# Altium footprint library ICs And Semiconductors SMD.PcbLib: 943 footprints (part 11 of 60)
Each footprint in its own frame and in the unit in brackets; x right, y up, seen from the top. Pads: shape width x height; smd on the part's side, far side on the other; paste and mask are expansions set on the pad; w line width, h text height; cw(c..) or ccw(c..) is an arc to the next point about the centre after c.
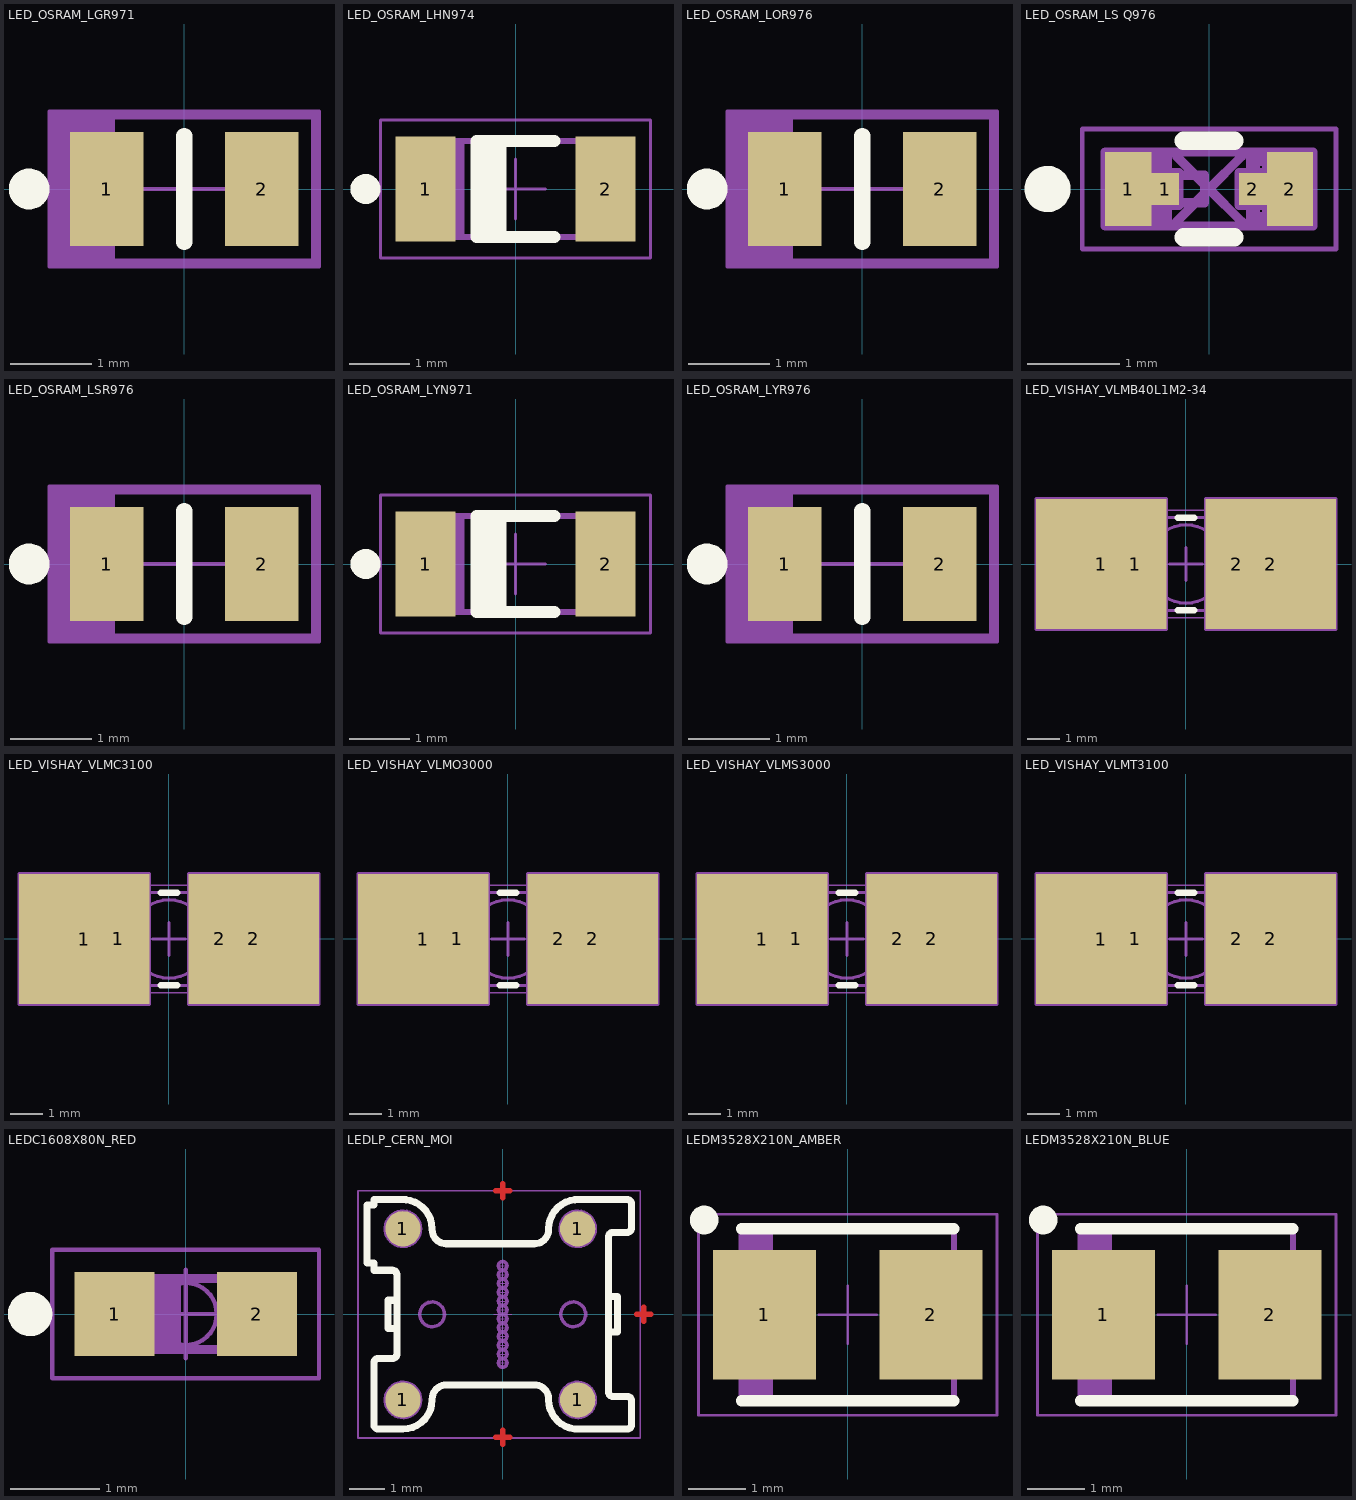
[diagram p10: the footprints below, top view; thin cyan lines are the x and y axes]

## LED_OSRAM_LGR971 [mm] "Green Chip LED, 2-Leads, Body 2.0x1.25mm, IPC Medium Density"
height 0.9
pads (2):
  rect 0.9x1.4 smd: 1(-0.95,0) 2(0.95,0)
Top Overlay:
  circle w0.25: c-1.9,0 r0.125
  lines w0.2: 0,-0.65 0,0.65
Mechanical 14:
  lines w0.1: -1.5,-0.9 -1.5,0.9 ; -1.4,-0.9 -1.4,0.9 ; -1.3,-0.9 -1.3,0.9 ; -1.2,-0.9 -1.2,0.9 ; -1.1,-0.9 -1.1,0.9 ; -1,-0.9 -1,0.9 ; -0.9,-0.9 -0.9,0.9 ; -1.6,-0.9 1.6,-0.9 1.6,0.9 -1.6,0.9 -1.6,-0.9
Mechanical 15:
  lines w0.05: -0.5,0 0.5,0 ; 0,-0.5 0,0.5 ; -1.65,-0.95 1.65,-0.95 1.65,0.95 -1.65,0.95 -1.65,-0.95
3D body "LED_OSRAM_LGR971.stp": height 0.9, standoff 0, extent -1.05,-0.675 1.05,0.675

## LED_OSRAM_LHN974 [mm] "Red Chip LED, 2-Leads, Body 3.2 x1.6mm, IPC Medium Density"
height 1.2
pads (2):
  rect 1x1.75 smd: 1(-1.5,0) 2(1.5,0)
Top Overlay:
  circle w0.25: c-2.5,0 r0.125
  lines w0.2: -0.45,-0.8 -0.45,0.8 ; -0.25,-0.8 -0.25,0.8 ; 0.65,-0.8 -0.65,-0.8 -0.65,0.8 0.65,0.8
Mechanical 14:
  lines w0.1: -1.5,-0.8 -1.5,0.8 ; -1.4,-0.8 -1.4,0.8 ; -1.3,-0.8 -1.3,0.8 ; -1.2,-0.8 -1.2,0.8 ; -1.1,-0.8 -1.1,0.8 ; -1,-0.8 -1,0.8 ; -0.9,-0.8 -0.9,0.8 ; -1.6,-0.8 -1.6,0.8 1.6,0.8 1.6,-0.8 -1.6,-0.8
Mechanical 15:
  lines w0.05: -0.5,0 0.5,0 ; 0,-0.5 0,0.5 ; -2.25,-1.15 -2.25,1.15 2.25,1.15 2.25,-1.15 -2.25,-1.15
3D body "LED_OSRAM_LHN974.stp": height 1.2, standoff 0, extent -1.65,-0.85 1.65,0.85

## LED_OSRAM_LOR976 [mm] "Orange Chip LED, 2-Leads, Body 2.0x1.25mm, IPC Medium Density"
height 0.9
pads (2):
  rect 0.9x1.4 smd: 1(-0.95,0) 2(0.95,0)
Top Overlay:
  circle w0.25: c-1.9,0 r0.125
  lines w0.2: 0,-0.65 0,0.65
Mechanical 14:
  lines w0.1: -1.5,-0.9 -1.5,0.9 ; -1.4,-0.9 -1.4,0.9 ; -1.3,-0.9 -1.3,0.9 ; -1.2,-0.9 -1.2,0.9 ; -1.1,-0.9 -1.1,0.9 ; -1,-0.9 -1,0.9 ; -0.9,-0.9 -0.9,0.9 ; -1.6,-0.9 -1.6,0.9 1.6,0.9 1.6,-0.9 -1.6,-0.9
Mechanical 15:
  lines w0.05: -0.5,0 0.5,0 ; 0,-0.5 0,0.5 ; -1.65,-0.95 -1.65,0.95 1.65,0.95 1.65,-0.95 -1.65,-0.95
3D body "LED_OSRAM_LOR976.stp": height 0.9, standoff 0, extent -1.05,-0.675 1.05,0.675

## LED_OSRAM_LS Q976 [mm] "Chip Super RED LED, 2-Leads, Body 1.6x0.8mm"
height 0.8
pads (4):
  rect 0.5x0.8 smd: 1(-0.875,0) 2(0.875,0)
  rect 0.3x0.35 smd: 1(-0.475,0) 2(0.475,0)
Top Overlay:
  circle w0.25: c-1.75,0 r0.125
  lines w0.2: -0.275,-0.525 0.275,-0.525 ; -0.275,0.525 0.275,0.525
Mechanical 8:
  lines w0.1: -0.354,-0.354 0,0 ; -0.354,0.354 0,0 ; 0.354,-0.354 0,0 ; 0.354,0.354 0,0 ; -1.125,-0.4 -0.875,0 -1.125,0.4 ; -1.125,-0.4 -0.625,-0.4 -0.625,-0.175 -0.325,-0.175 ; -1.125,-0.4 -1.125,0.4 ; -1.125,0.4 -0.625,0.4 -0.625,0.175 -0.325,0.175 ; -0.325,-0.175 -0.475,0 -0.325,0.175 ; -0.325,-0.175 -0.325,0.175 ; 0.325,-0.175 0.475,0 0.325,0.175 ; 0.325,-0.175 0.625,-0.175 0.625,-0.4 1.125,-0.4 ; 0.325,-0.175 0.325,0.175 ; 0.325,0.175 0.625,0.175 0.625,0.4 1.125,0.4 ; 1.125,-0.4 0.875,0 1.125,0.4 ; 1.125,-0.4 1.125,0.4
Mechanical 14:
  lines w0.1: -0.8,-0.3 -0.5,-0.3 ; -0.8,0.3 -0.499,0.3 ; -0.548,-0.4 -0.548,0.4 ; -0.5,-0.4 -0.5,0.4 ; -0.499,-0.2 -0.8,-0.2 ; -0.499,0.2 -0.8,0.2 ; -0.452,-0.4 -0.452,0.4 ; 0.452,-0.4 0.452,0.4 ; 0.499,-0.3 0.8,-0.3 ; 0.5,-0.4 0.5,0.4 ; 0.5,0.3 0.8,0.3 ; -0.8,-0.2 ccw(c-0.8,0) -0.8,0.2 ; -0.8,-0.2 -0.8,-0.4 0.8,-0.4 0.8,-0.2 cw(c0.8,0) 0.8,0.2 0.8,0.4 -0.8,0.4 -0.8,0.2 ; -0.35,-0.15 -0.05,-0.15 -0.05,0.15 -0.35,0.15 -0.35,-0.15
Mechanical 15:
  lines w0.05: -1.375,-0.65 -1.375,0.65 1.375,0.65 1.375,-0.65 -1.375,-0.65
3D body "LED_OSRAM_LS Q976_Part1.stp": height 0.51, standoff 0, extent -0.8,-0.4 0.8,0.4
3D body "LED_OSRAM_LS Q976_Part2.stp": height 0.8, standoff 0.31, extent -0.5,-0.4 0.5,0.4

## LED_OSRAM_LSR976 [mm] "Super Red Chip LED, 2-Leads, Body 2.0x1.25mm, IPC Medium Density"
height 0.9
pads (2):
  rect 0.9x1.4 smd: 1(-0.95,0) 2(0.95,0)
Top Overlay:
  circle w0.25: c-1.9,0 r0.125
  lines w0.2: 0,-0.65 0,0.65
Mechanical 14:
  lines w0.1: -1.5,-0.9 -1.5,0.9 ; -1.4,-0.9 -1.4,0.9 ; -1.3,-0.9 -1.3,0.9 ; -1.2,-0.9 -1.2,0.9 ; -1.1,-0.9 -1.1,0.9 ; -1,-0.9 -1,0.9 ; -0.9,-0.9 -0.9,0.9 ; -1.6,-0.9 1.6,-0.9 1.6,0.9 -1.6,0.9 -1.6,-0.9
Mechanical 15:
  lines w0.05: -0.5,0 0.5,0 ; 0,-0.5 0,0.5 ; -1.65,-0.95 1.65,-0.95 1.65,0.95 -1.65,0.95 -1.65,-0.95
3D body "LED_OSRAM_LSR976.stp": height 0.9, standoff 0, extent -1.05,-0.675 1.05,0.675

## LED_OSRAM_LYN971 [mm] "Yellow Chip LED, 2-Leads, Body 3.2 x1.6mm, IPC Medium Density"
height 1.2
pads (2):
  rect 1x1.75 smd: 1(-1.5,0) 2(1.5,0)
Top Overlay:
  circle w0.25: c-2.5,0 r0.125
  lines w0.2: -0.45,-0.8 -0.45,0.8 ; -0.25,-0.8 -0.25,0.8 ; 0.65,-0.8 -0.65,-0.8 -0.65,0.8 0.65,0.8
Mechanical 14:
  lines w0.1: -1.5,-0.8 -1.5,0.8 ; -1.4,-0.8 -1.4,0.8 ; -1.3,-0.8 -1.3,0.8 ; -1.2,-0.8 -1.2,0.8 ; -1.1,-0.8 -1.1,0.8 ; -1,-0.8 -1,0.8 ; -0.9,-0.8 -0.9,0.8 ; -1.6,-0.8 1.6,-0.8 1.6,0.8 -1.6,0.8 -1.6,-0.8
Mechanical 15:
  lines w0.05: -0.5,0 0.5,0 ; 0,-0.5 0,0.5 ; -2.25,-1.15 2.25,-1.15 2.25,1.15 -2.25,1.15 -2.25,-1.15
3D body "LED_OSRAM_LYN971.stp": height 1.2, standoff 0, extent -1.65,-0.85 1.65,0.85

## LED_OSRAM_LYR976 [mm] "Yellow Chip LED, 2-Leads, Body 2.0x1.25mm, IPC Medium Density"
height 0.9
pads (2):
  rect 0.9x1.4 smd: 1(-0.95,0) 2(0.95,0)
Top Overlay:
  circle w0.25: c-1.9,0 r0.125
  lines w0.2: 0,-0.65 0,0.65
Mechanical 14:
  lines w0.1: -1.5,-0.9 -1.5,0.9 ; -1.4,-0.9 -1.4,0.9 ; -1.3,-0.9 -1.3,0.9 ; -1.2,-0.9 -1.2,0.9 ; -1.1,-0.9 -1.1,0.9 ; -1,-0.9 -1,0.9 ; -0.9,-0.9 -0.9,0.9 ; -1.6,-0.9 -1.6,0.9 1.6,0.9 1.6,-0.9 -1.6,-0.9
Mechanical 15:
  lines w0.05: -0.5,0 0.5,0 ; 0,-0.5 0,0.5 ; -1.65,-0.95 -1.65,0.95 1.65,0.95 1.65,-0.95 -1.65,-0.95
3D body "LED_OSRAM_LYR976.stp": height 0.9, standoff 0, extent -1.05,-0.675 1.05,0.675

## LED_VISHAY_VLMB40L1M2-34 [mm] "PLCC-2 Molded SMD Blue LED, 2-Leads, Body 3.5x2.8mm"
height 1.85
pads (4):
  rect 4x4 smd paste-2 mask-2: 1(-2.6,0) 2(2.6,0)
  rect 1.9x2.8 smd: 1(-1.55,0) 2(1.55,0)
Top Overlay:
  circle w0.25: c-2.9,1.65 r0.125
  lines w0.2: -0.25,-1.425 0.25,-1.425 ; -0.25,1.425 0.25,1.425
Mechanical 8:
  lines w0.1: -2.05,0 -1.55,0 ; -1.55,-0.5 -1.55,0 ; -1.55,0.5 -1.55,0 ; -1.05,0 -1.55,0 ; -0.5,0 0,0 ; 0,-0.5 0,0 ; 0,0.5 0,0 ; 0.5,0 0,0 ; 1.05,0 1.55,0 ; 1.55,-0.5 1.55,0 ; 1.55,0.5 1.55,0 ; 2.05,0 1.55,0 ; -4.6,-2 -4.6,2 -0.6,2 -0.6,-2 -4.6,-2 ; -2.5,-1.4 -2.5,1.4 -0.6,1.4 -0.6,-1.4 -2.5,-1.4 ; 0.6,-2 0.6,2 4.6,2 4.6,-2 0.6,-2 ; 0.6,-1.4 0.6,1.4 2.5,1.4 2.5,-1.4 0.6,-1.4
Mechanical 14:
  circle w0.1: c0,0 r1.2
  lines w0.1: -1.85,1.1 -1.85,-1.1 -1.575,-1.1 ; -1.849,1.1 -1.575,1.1 ; -1.575,0.618 -0.768,1.425 ; -1.575,0.759 -0.909,1.425 ; -1.575,0.901 -1.051,1.425 ; -1.575,1.042 -1.192,1.425 ; -1.575,1.184 -1.334,1.425 ; -1.575,1.325 -1.475,1.425 ; 1.575,-1.1 1.85,-1.1 1.85,1.1 1.575,1.1 ; -1.575,-1.425 -1.575,1.425 ; -1.575,-1.425 1.575,-1.425 1.575,1.425 -1.575,1.425 ; -1.575,-1.425 -1.575,1.425
Mechanical 15:
  lines w0.05: -2.75,-1.65 -2.75,1.65 2.75,1.65 2.75,-1.65 -2.75,-1.65
3D body "LED_VISHAY_VLMB40L1M2-34.stp": height 1.75, standoff 0, extent -1.85,-1.425 1.85,1.425

## LED_VISHAY_VLMC3100 [mm] "Molded SMD Green LED, 2-Leads, Body 3.5x2.8mm, VLMC3100 Series"
height 1.85
pads (4):
  rect 4x4 smd paste-2 mask-2: 1(-2.6,0) 2(2.6,0)
  rect 1.9x2.8 smd: 1(-1.55,0) 2(1.55,0)
Top Overlay:
  circle w0.25: c-2.9,1.65 r0.125
  lines w0.2: -0.25,-1.425 0.25,-1.425 ; -0.25,1.425 0.25,1.425
Mechanical 8:
  lines w0.1: -2.05,0 -1.55,0 ; -1.55,-0.5 -1.55,0 ; -1.55,0.5 -1.55,0 ; -1.05,0 -1.55,0 ; -0.5,0 0,0 ; 0,-0.5 0,0 ; 0,0.5 0,0 ; 0.5,0 0,0 ; 1.05,0 1.55,0 ; 1.55,-0.5 1.55,0 ; 1.55,0.5 1.55,0 ; 2.05,0 1.55,0 ; -4.6,-2 -4.6,2 -0.6,2 -0.6,-2 -4.6,-2 ; -2.5,-1.4 -2.5,1.4 -0.6,1.4 -0.6,-1.4 -2.5,-1.4 ; 0.6,-2 0.6,2 4.6,2 4.6,-2 0.6,-2 ; 0.6,-1.4 0.6,1.4 2.5,1.4 2.5,-1.4 0.6,-1.4
Mechanical 14:
  circle w0.1: c0,0 r1.2
  lines w0.1: -1.85,1.1 -1.85,-1.1 -1.575,-1.1 ; -1.849,1.1 -1.575,1.1 ; -1.575,0.618 -0.768,1.425 ; -1.575,0.759 -0.909,1.425 ; -1.575,0.901 -1.051,1.425 ; -1.575,1.042 -1.192,1.425 ; -1.575,1.184 -1.334,1.425 ; -1.575,1.325 -1.475,1.425 ; 1.575,-1.1 1.85,-1.1 1.85,1.1 1.575,1.1 ; -1.575,-1.425 -1.575,1.425 ; -1.575,-1.425 1.575,-1.425 1.575,1.425 -1.575,1.425 ; -1.575,-1.425 -1.575,1.425
Mechanical 15:
  lines w0.05: -2.75,-1.65 -2.75,1.65 2.75,1.65 2.75,-1.65 -2.75,-1.65
3D body "LED_VISHAY_VLMC3100.stp": height 1.75, standoff 0, extent -1.85,-1.425 1.85,1.425

## LED_VISHAY_VLMO3000 [mm] "Molded SMD Orange LED, 2-Leads, Body 3.5x2.8mm, VLMO3000 Series"
height 1.85
pads (4):
  rect 4x4 smd paste-2 mask-2: 1(-2.6,0) 2(2.6,0)
  rect 1.9x2.8 smd: 1(-1.55,0) 2(1.55,0)
Top Overlay:
  circle w0.25: c-2.9,1.65 r0.125
  lines w0.2: -0.25,-1.425 0.25,-1.425 ; -0.25,1.425 0.25,1.425
Mechanical 8:
  lines w0.1: -2.05,0 -1.55,0 ; -1.55,-0.5 -1.55,0 ; -1.55,0.5 -1.55,0 ; -1.05,0 -1.55,0 ; -0.5,0 0,0 ; 0,-0.5 0,0 ; 0,0.5 0,0 ; 0.5,0 0,0 ; 1.05,0 1.55,0 ; 1.55,-0.5 1.55,0 ; 1.55,0.5 1.55,0 ; 2.05,0 1.55,0 ; -4.6,-2 -0.6,-2 -0.6,2 -4.6,2 -4.6,-2 ; -2.5,-1.4 -0.6,-1.4 -0.6,1.4 -2.5,1.4 -2.5,-1.4 ; 0.6,-2 4.6,-2 4.6,2 0.6,2 0.6,-2 ; 0.6,-1.4 2.5,-1.4 2.5,1.4 0.6,1.4 0.6,-1.4
Mechanical 14:
  circle w0.1: c0,0 r1.2
  lines w0.1: -1.85,1.1 -1.85,-1.1 -1.575,-1.1 ; -1.849,1.1 -1.575,1.1 ; -1.575,0.618 -0.768,1.425 ; -1.575,0.759 -0.909,1.425 ; -1.575,0.901 -1.051,1.425 ; -1.575,1.042 -1.192,1.425 ; -1.575,1.184 -1.334,1.425 ; -1.575,1.325 -1.475,1.425 ; 1.575,-1.1 1.85,-1.1 1.85,1.1 1.575,1.1 ; -1.575,-1.425 -1.575,1.425 ; -1.575,-1.425 1.575,-1.425 1.575,1.425 -1.575,1.425 ; -1.575,-1.425 -1.575,1.425
Mechanical 15:
  lines w0.05: -2.75,-1.65 2.75,-1.65 2.75,1.65 -2.75,1.65 -2.75,-1.65
3D body "LED_VISHAY_VLMO3000.stp": height 1.75, standoff 0, extent -1.85,-1.425 1.85,1.425

## LED_VISHAY_VLMS3000 [mm] "Molded SMD Super Red LED, 2-Leads, Body 3.5x2.8mm, VLMS3000 Series"
height 1.85
pads (4):
  rect 4x4 smd paste-2 mask-2: 1(-2.6,0) 2(2.6,0)
  rect 1.9x2.8 smd: 1(-1.55,0) 2(1.55,0)
Top Overlay:
  circle w0.25: c-2.9,1.65 r0.125
  lines w0.2: -0.25,-1.425 0.25,-1.425 ; -0.25,1.425 0.25,1.425
Mechanical 8:
  lines w0.1: -2.05,0 -1.55,0 ; -1.55,-0.5 -1.55,0 ; -1.55,0.5 -1.55,0 ; -1.05,0 -1.55,0 ; -0.5,0 0,0 ; 0,-0.5 0,0 ; 0,0.5 0,0 ; 0.5,0 0,0 ; 1.05,0 1.55,0 ; 1.55,-0.5 1.55,0 ; 1.55,0.5 1.55,0 ; 2.05,0 1.55,0 ; -4.6,-2 -4.6,2 -0.6,2 -0.6,-2 -4.6,-2 ; -2.5,-1.4 -2.5,1.4 -0.6,1.4 -0.6,-1.4 -2.5,-1.4 ; 0.6,-2 0.6,2 4.6,2 4.6,-2 0.6,-2 ; 0.6,-1.4 0.6,1.4 2.5,1.4 2.5,-1.4 0.6,-1.4
Mechanical 14:
  circle w0.1: c0,0 r1.2
  lines w0.1: -1.85,1.1 -1.85,-1.1 -1.575,-1.1 ; -1.849,1.1 -1.575,1.1 ; -1.575,0.618 -0.768,1.425 ; -1.575,0.759 -0.909,1.425 ; -1.575,0.901 -1.051,1.425 ; -1.575,1.042 -1.192,1.425 ; -1.575,1.184 -1.334,1.425 ; -1.575,1.325 -1.475,1.425 ; 1.575,-1.1 1.85,-1.1 1.85,1.1 1.575,1.1 ; -1.575,-1.425 -1.575,1.425 ; -1.575,-1.425 1.575,-1.425 1.575,1.425 -1.575,1.425 ; -1.575,-1.425 -1.575,1.425
Mechanical 15:
  lines w0.05: -2.75,-1.65 -2.75,1.65 2.75,1.65 2.75,-1.65 -2.75,-1.65
3D body "LED_VISHAY_VLMS3000.stp": height 1.75, standoff 0, extent -1.85,-1.425 1.85,1.425

## LED_VISHAY_VLMT3100 [mm] "Molded SMD Red LED, 2-Leads, Body 3.5x2.8mm, VLMT3100 Series"
height 1.85
pads (4):
  rect 4x4 smd paste-2 mask-2: 1(-2.6,0) 2(2.6,0)
  rect 1.9x2.8 smd: 1(-1.55,0) 2(1.55,0)
Top Overlay:
  circle w0.25: c-2.9,1.65 r0.125
  lines w0.2: -0.25,-1.425 0.25,-1.425 ; -0.25,1.425 0.25,1.425
Mechanical 8:
  lines w0.1: -2.05,0 -1.55,0 ; -1.55,-0.5 -1.55,0 ; -1.55,0.5 -1.55,0 ; -1.05,0 -1.55,0 ; -0.5,0 0,0 ; 0,-0.5 0,0 ; 0,0.5 0,0 ; 0.5,0 0,0 ; 1.05,0 1.55,0 ; 1.55,-0.5 1.55,0 ; 1.55,0.5 1.55,0 ; 2.05,0 1.55,0 ; -4.6,-2 -0.6,-2 -0.6,2 -4.6,2 -4.6,-2 ; -2.5,-1.4 -0.6,-1.4 -0.6,1.4 -2.5,1.4 -2.5,-1.4 ; 0.6,-2 4.6,-2 4.6,2 0.6,2 0.6,-2 ; 0.6,-1.4 2.5,-1.4 2.5,1.4 0.6,1.4 0.6,-1.4
Mechanical 14:
  circle w0.1: c0,0 r1.2
  lines w0.1: -1.85,1.1 -1.85,-1.1 -1.575,-1.1 ; -1.849,1.1 -1.575,1.1 ; -1.575,0.618 -0.768,1.425 ; -1.575,0.759 -0.909,1.425 ; -1.575,0.901 -1.051,1.425 ; -1.575,1.042 -1.192,1.425 ; -1.575,1.184 -1.334,1.425 ; -1.575,1.325 -1.475,1.425 ; 1.575,-1.1 1.85,-1.1 1.85,1.1 1.575,1.1 ; -1.575,-1.425 -1.575,1.425 ; -1.575,-1.425 1.575,-1.425 1.575,1.425 -1.575,1.425 ; -1.575,-1.425 -1.575,1.425
Mechanical 15:
  lines w0.05: -2.75,-1.65 2.75,-1.65 2.75,1.65 -2.75,1.65 -2.75,-1.65
3D body "LED_VISHAY_VLMT3100.stp": height 1.75, standoff 0, extent -1.85,-1.425 1.85,1.425

## LEDC1608X80N_RED [mm] "Chip RED LED, 2-Leads, Body 1.6x0.8mm, IPC Medium Density"
height 0.8
pads (2):
  rect 0.9x0.95 smd: 1(-0.8,0) 2(0.8,0)
Top Overlay:
  circle w0.25: c-1.75,0 r0.125
Mechanical 14:
  lines w0.1: -0.7,-0.4 -0.7,0.4 ; -0.6,-0.4 -0.6,0.4 ; -0.5,-0.4 -0.5,0.4 ; -0.4,-0.4 -0.4,0.4 ; -0.3,-0.4 -0.3,0.4 ; -0.2,-0.4 -0.2,0.4 ; -0.1,-0.4 -0.1,0.4 ; -0.8,-0.4 -0.8,0.4 0.8,0.4 0.8,-0.4 -0.8,-0.4
Mechanical 15:
  circle w0.05: c0,0 r0.35
  lines w0.05: -0.5,0 0.5,0 ; 0,-0.5 0,0.5 ; -1.5,-0.725 -1.5,0.725 1.5,0.725 1.5,-0.725 -1.5,-0.725
3D body "LEDC1608X80N_RED.stp": height 0.8, standoff 0, extent -0.8,-0.4 0.8,0.4

## LEDLP_CERN_MOI [mm] "12x Light Pipe Lens, Body 6.5 x 7.3mm"
height 1.5
pads (4):
  round 1 smd paste-0.5: 1(-2.825,-2.425) 1(-2.825,2.425) 1(2.125,-2.425) 1(2.125,2.425)
Top Layer:
  lines w0.15: -0.2,-3.48 0.2,-3.48 ; -0.2,3.5 0.2,3.5 ; 0,-3.68 0,-3.28 ; 0,3.3 0,3.7 ; 3.8,0 4.2,0 ; 4,-0.2 4,0.2
Top Overlay:
  lines w0.2: -3,-0.4 -3.25,-0.4 -3.25,0.4 -3,0.4 ; 3,-0.5 3.25,-0.5 3.25,0.5 3,0.5 ; -3.85,1.45 -3.85,3.1 -3.65,3.1 -3.65,3.25 -2.876,3.25 cw(c-2.829,2.422) -2,2.425 -2,2.399 ccw(c-1.601,2.399) -1.6,2 0.9,2 ccw(c0.901,2.399) 1.3,2.399 1.3,2.425 cw(c2.129,2.422) 2.176,3.25 3.525,3.25 cw(c3.525,3.125) 3.65,3.125 3.65,2.454 cw(c3.525,2.45) 3.525,2.325 3.125,2.325 ccw(c3.125,2.2) 3,2.2 3,-2.2 ccw(c3.125,-2.2) 3.125,-2.325 3.525,-2.325 cw(c3.525,-2.45) 3.65,-2.454 3.65,-3.125 cw(c3.525,-3.125) 3.525,-3.25 2.176,-3.25 cw(c2.129,-2.422) 1.3,-2.425 1.3,-2.399 ccw(c0.901,-2.399) 0.9,-2 -1.6,-2 ccw(c-1.601,-2.399) -2,-2.399 -2,-2.425 cw(c-2.827,-2.423) -2.828,-3.25 -3.525,-3.25 cw(c-3.525,-3.125) -3.65,-3.125 -3.65,-1.379 cw(c-3.525,-1.375) -3.525,-1.25 -3.125,-1.25 ccw(c-3.125,-1.125) -3,-1.125 -3,1.125 ccw(c-3.125,1.125) -3.125,1.25 -3.65,1.25 -3.65,1.45 -3.85,1.45
Top Solder:
  region: -0.4,3.9 -0.4,3.1 0.4,3.1 0.4,3.9
  region: -0.4,-3.08 -0.4,-3.88 0.4,-3.88 0.4,-3.08
  region: 3.6,0.4 3.6,-0.4 4.4,-0.4 4.4,0.4
Mechanical 8:
  circle w0.05: c-2.825,-2.425 r0.5
  circle w0.05: c-2.825,2.425 r0.5
  circle w0.05: c2.125,2.425 r0.5
  circle w0.05: c2.125,-2.425 r0.5
  lines w0.01: -0.25,0 0,0 ; -0.125,-1.375 0,-1.375 ; -0.125,-1.125 0,-1.125 ; -0.125,-0.875 0,-0.875 ; -0.125,-0.625 0,-0.625 ; -0.125,-0.375 0,-0.375 ; -0.125,-0.125 0,-0.125 ; -0.125,0.125 0,0.125 ; -0.125,0.375 0,0.375 ; -0.125,0.625 0,0.625 ; -0.125,0.875 0,0.875 ; -0.125,1.125 0,1.125 ; -0.125,1.375 0,1.375 ; 0,-1.5 0,-1.375 ; 0,1.5 0,1.375 ; 0.125,-1.375 0,-1.375 ; 0.125,-1.125 0,-1.125 ; 0.125,-0.875 0,-0.875 ; 0.125,-0.625 0,-0.625 ; 0.125,-0.375 0,-0.375 ; 0.125,-0.125 0,-0.125 ; 0.125,0.125 0,0.125 ; 0.125,0.375 0,0.375 ; 0.125,0.625 0,0.625 ; 0.125,0.875 0,0.875 ; 0.125,1.125 0,1.125 ; 0.125,1.375 0,1.375 ; 0.25,0 0,0 ; 0,-1.375 0,-1.25 0,-1.125 ; 0,-1.125 0,-1 0,-0.875 ; 0,-0.875 0,-0.75 0,-0.625 ; 0,-0.625 0,-0.5 0,-0.375 ; 0,-0.375 0,-0.25 ; 0,-0.25 0,0 ; 0,-0.25 0,-0.125 ; 0,-0.125 0,0 ; 0,0 0,0.25 ; 0,0 0,0.125 ; 0,0.125 0,0.25 ; 0,0.25 0,0.375 ; 0,0.375 0,0.5 0,0.625 ; 0,0.625 0,0.75 0,0.875 ; 0,0.875 0,1 0,1.125 ; 0,1.125 0,1.25 0,1.375
  lines w0.05: -3.075,-2.425 -2.825,-2.425 ; -3.075,2.425 -2.825,2.425 ; -2.825,-2.675 -2.825,-2.425 ; -2.825,-2.175 -2.825,-2.425 ; -2.825,2.175 -2.825,2.425 ; -2.825,2.675 -2.825,2.425 ; -2.575,-2.425 -2.825,-2.425 ; -2.575,2.425 -2.825,2.425 ; 1.875,-2.425 2.125,-2.425 ; 1.875,2.425 2.125,2.425 ; 2.125,-2.675 2.125,-2.425 ; 2.125,-2.175 2.125,-2.425 ; 2.125,2.175 2.125,2.425 ; 2.125,2.675 2.125,2.425 ; 2.375,-2.425 2.125,-2.425 ; 2.375,2.425 2.125,2.425
Mechanical 14:
  circle w0.1: c-2,0 r0.351
  circle w0.1: c2,0 r0.351
  circle w0.1: c-2.825,2.425 r0.5
  circle w0.1: c2.125,2.425 r0.5
  circle w0.1: c2.125,-2.425 r0.5
  circle w0.1: c-2.825,-2.425 r0.5
  circle w0.1: c0,1.375 r0.122
  circle w0.1: c0,1.125 r0.122
  circle w0.1: c0,0.875 r0.122
  circle w0.1: c0,0.625 r0.122
  circle w0.1: c0,0.375 r0.122
  circle w0.1: c0,0.125 r0.122
  circle w0.1: c0,-0.125 r0.122
  circle w0.1: c0,-0.375 r0.122
  circle w0.1: c0,-0.625 r0.122
  circle w0.1: c0,-0.875 r0.122
  circle w0.1: c0,-1.125 r0.122
  circle w0.1: c0,-1.375 r0.122
  lines w0.1: -3,-0.4 -3.25,-0.4 -3.25,0.4 -3,0.4 ; 3,-0.5 3.25,-0.5 3.25,0.5 3,0.5 ; -3.85,1.45 -3.85,3.1 -3.65,3.1 -3.65,3.25 -2.876,3.25 cw(c-2.829,2.422) -2,2.425 -2,2.399 ccw(c-1.601,2.399) -1.6,2 0.9,2 ccw(c0.901,2.399) 1.3,2.399 1.3,2.425 cw(c2.129,2.422) 2.176,3.25 3.525,3.25 cw(c3.525,3.125) 3.65,3.125 3.65,2.454 cw(c3.525,2.45) 3.525,2.325 3.125,2.325 ccw(c3.125,2.2) 3,2.2 3,-2.2 ccw(c3.125,-2.2) 3.125,-2.325 3.525,-2.325 cw(c3.525,-2.45) 3.65,-2.454 3.65,-3.125 cw(c3.525,-3.125) 3.525,-3.25 2.176,-3.25 cw(c2.129,-2.422) 1.3,-2.425 1.3,-2.399 ccw(c0.901,-2.399) 0.9,-2 -1.6,-2 ccw(c-1.601,-2.399) -2,-2.399 -2,-2.425 cw(c-2.827,-2.423) -2.828,-3.25 -3.525,-3.25 cw(c-3.525,-3.125) -3.65,-3.125 -3.65,-1.379 cw(c-3.525,-1.375) -3.525,-1.25 -3.125,-1.25 ccw(c-3.125,-1.125) -3,-1.125 -3,1.125 ccw(c-3.125,1.125) -3.125,1.25 -3.65,1.25 -3.65,1.45 -3.85,1.45
Mechanical 15:
  lines w0.05: -4.1,-3.5 3.9,-3.5 3.9,3.5 -4.1,3.5 -4.1,-3.5
3D body "LEDLP_CERN_MOI.stp": height 1.51, standoff 0, extent -3.85,-3.25 3.65,3.25

## LEDM3528X210N_AMBER [mm] "Molded SMD AMBER LED, 2-Leads, Body 3.5x2.8mm, IPC Medium Density"
height 2.1
pads (2):
  rect 1.8x2.25 smd: 1(-1.45,0) 2(1.45,0)
Top Overlay:
  circle w0.25: c-2.5,1.65 r0.125
  lines w0.2: -1.85,-1.5 1.85,-1.5 ; -1.85,1.5 1.85,1.5
Mechanical 14:
  lines w0.1: -1.8,-1.5 -1.8,1.5 ; -1.725,-1.5 -1.725,1.5 ; -1.65,-1.5 -1.65,1.5 ; -1.575,-1.5 -1.575,1.5 ; -1.5,-1.5 -1.5,1.5 ; -1.425,-1.5 -1.425,1.5 ; -1.35,-1.5 -1.35,1.5 ; -1.85,-1.5 -1.85,1.5 1.85,1.5 1.85,-1.5 -1.85,-1.5
Mechanical 15:
  lines w0.05: -0.5,0 0.5,0 ; 0,-0.5 0,0.5 ; -2.6,-1.75 -2.6,1.75 2.6,1.75 2.6,-1.75 -2.6,-1.75
3D body "LEDM3528X210N_AMBER.stp": height 2.1, standoff 0, extent -1.85,-1.5 1.85,1.5

## LEDM3528X210N_BLUE [mm] "Molded SMD Blue LED, 2-Leads, Body 3.5x2.8mm, IPC Medium Density"
height 2.1
pads (2):
  rect 1.8x2.25 smd: 1(-1.45,0) 2(1.45,0)
Top Overlay:
  circle w0.25: c-2.5,1.65 r0.125
  lines w0.2: -1.85,-1.5 1.85,-1.5 ; -1.85,1.5 1.85,1.5
Mechanical 14:
  lines w0.1: -1.8,-1.5 -1.8,1.5 ; -1.725,-1.5 -1.725,1.5 ; -1.65,-1.5 -1.65,1.5 ; -1.575,-1.5 -1.575,1.5 ; -1.5,-1.5 -1.5,1.5 ; -1.425,-1.5 -1.425,1.5 ; -1.35,-1.5 -1.35,1.5 ; -1.85,-1.5 -1.85,1.5 1.85,1.5 1.85,-1.5 -1.85,-1.5
Mechanical 15:
  lines w0.05: -0.5,0 0.5,0 ; 0,-0.5 0,0.5 ; -2.6,-1.75 -2.6,1.75 2.6,1.75 2.6,-1.75 -2.6,-1.75
3D body "LEDM3528X210N_BLUE.stp": height 2.1, standoff 0, extent -1.85,-1.5 1.85,1.5